# Altium footprint library First Board IMX6.PcbLib: 204 footprints (part 8 of 13)
Each footprint in its own frame and in the unit in brackets; x right, y up, seen from the top. Pads: shape width x height; smd on the part's side, far side on the other; paste and mask are expansions set on the pad; w line width, h text height; cw(c..) or ccw(c..) is an arc to the next point about the centre after c.
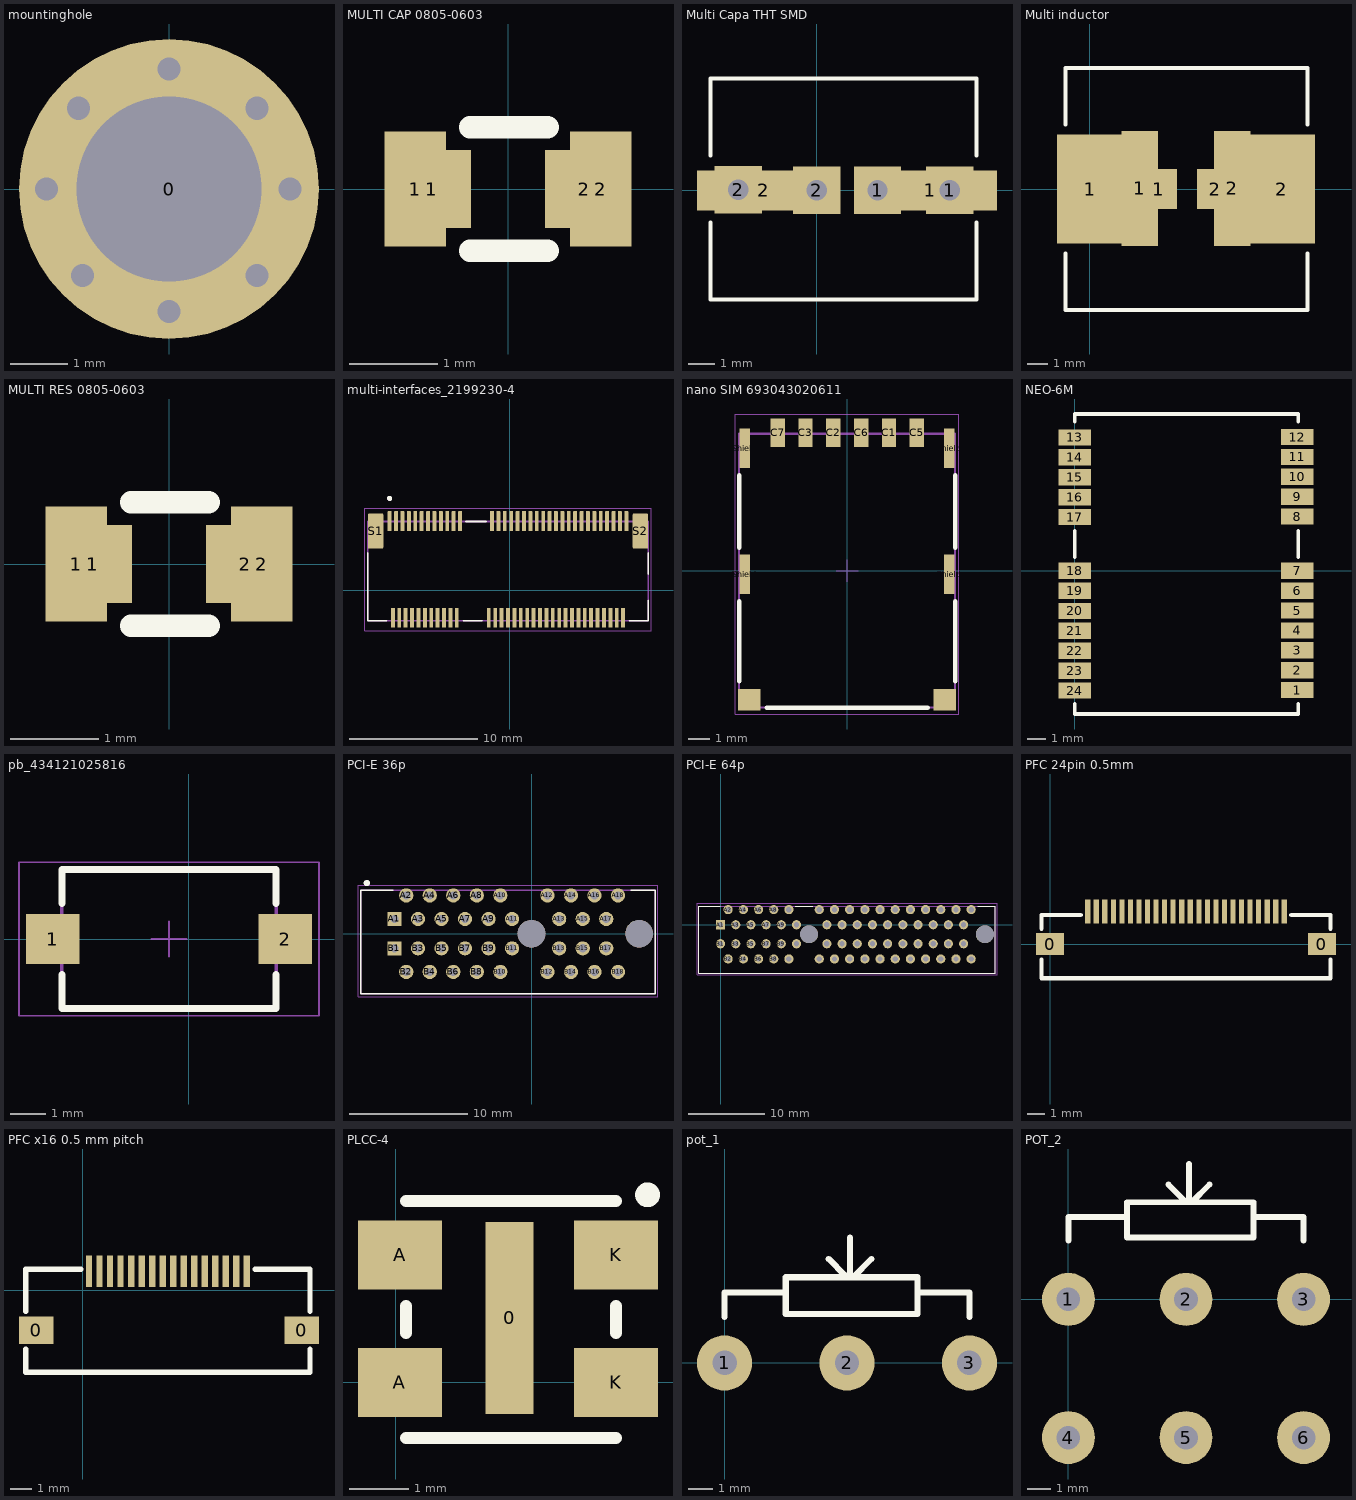
[diagram p7: the footprints below, top view; thin cyan lines are the x and y axes]

## mountinghole [mm]
pads (1):
  round 5.2 hole 3.2: 0(0,0)
via 2.1,0 diameter 0.7 hole 0.4
via 0,-2.125 diameter 0.7 hole 0.4
via -2.125,0 diameter 0.7 hole 0.4
via -1.5,-1.5 diameter 0.7 hole 0.4
via 1.525,-1.5 diameter 0.7 hole 0.4
via 1.525,1.4 diameter 0.7 hole 0.4
via -1.565,1.4 diameter 0.7 hole 0.4
via -0.002,2.083 diameter 0.7 hole 0.4

## MULTI CAP 0805-0603 [mm]
pads (4):
  rect 0.7x1.3 smd: 1(-1.05,0) 2(1.05,0)
  rect 0.889x0.889 smd: 1(-0.864,0) 2(0.864,0)
Top Overlay:
  lines w0.254: -0.431,-0.7 0.45,-0.7 ; -0.431,0.7 0.45,0.7
3D body "CAPACITOR 0805.step": height 0.63, standoff 0.03, extent -1,-0.615 1,0.635

## Multi Capa THT SMD [mil]
pads (6):
  rect 70x70 hole 30: 1(90,0) 1(196.85,0) 2(-116.14,0.98) 2(0,0)
  rect 196.85x59.06 smd: 1(168.31,0) 2(-78.74,0)
Top Overlay:
  lines w5.91: -157.48,-47.24 -157.48,-161.42 236.22,-161.42 236.22,-47.24 ; -157.48,51.18 -157.48,165.35 236.22,165.35 236.22,51.18
3D body "capacitor size F.step": height 401.77, standoff -0.2, extent -155.51,-162.4 234.25,164.37

## Multi inductor [mm]
pads (6):
  rect 3.3x5.4 smd: 1(0.025,0) 2(9.525,0)
  rect 1.8x5.7 smd: 1(2.475,0.025) 2(7.075,0.025)
  rect 1.8x2 smd: 1(3.425,0) 2(6.225,0)
Top Overlay:
  lines w0.2: -1.2,-3.2 -1.2,-6 10.8,-6 10.8,-3.2 ; -1.2,3.2 -1.2,6 10.8,6 10.8,3.2
3D body "inductor 6x6mm.step": height 8.25, standoff 0.25, extent -1.175,-6 10.825,6

## MULTI RES 0805-0603 [mm]
pads (4):
  rect 0.7x1.3 smd: 1(-1.05,0) 2(1.05,0)
  rect 0.889x0.889 smd: 1(-0.864,0) 2(0.864,0)
Top Overlay:
  lines w0.254: -0.431,-0.7 0.45,-0.7 ; -0.431,0.7 0.45,0.7
3D body "0805.step": height 0.58, standoff 0.03, extent -1.05,-0.625 0.95,0.625

## multi-interfaces_2199230-4 [mm]
pads (69):
  rrect15% 0.3x1.55 smd: 1(-9.377,5.402) 2(-9.127,-2.148) 3(-8.877,5.402) 4(-8.627,-2.148) 5(-8.377,5.402) 6(-8.127,-2.148) 7(-7.877,5.402) 8(-7.627,-2.148) 9(-7.377,5.402) 10(-7.127,-2.148) 11(-6.877,5.402) 12(-6.627,-2.148) 13(-6.377,5.402) 14(-6.127,-2.148) 15(-5.877,5.402) 16(-5.627,-2.148) 17(-5.377,5.402) 18(-5.127,-2.148) 19(-4.877,5.402) 20(-4.627,-2.148) 21(-4.377,5.402) 22(-4.127,-2.148) 23(-3.877,5.402) 32(-1.627,-2.148) 33(-1.377,5.402) 34(-1.127,-2.148) 35(-0.877,5.402) 36(-0.627,-2.148) 37(-0.377,5.402) 38(-0.127,-2.148) 39(0.123,5.402) 40(0.373,-2.148) 41(0.623,5.402) 42(0.873,-2.148) 43(1.123,5.402) 44(1.373,-2.148) 45(1.623,5.402) 46(1.873,-2.148) 47(2.123,5.402) 48(2.373,-2.148) 49(2.623,5.402) 50(2.873,-2.148) 51(3.123,5.402) 52(3.373,-2.148) 53(3.623,5.402) 54(3.873,-2.148) 55(4.123,5.402) 56(4.373,-2.148) 57(4.623,5.402) 58(4.873,-2.148) 59(5.123,5.402) 60(5.373,-2.148) 61(5.623,5.402) 62(5.873,-2.148) 63(6.123,5.402) 64(6.373,-2.148) 65(6.623,5.402) 66(6.873,-2.148) 67(7.123,5.402) 68(7.373,-2.148) 69(7.623,5.402) 70(7.873,-2.148) 71(8.123,5.402) 72(8.373,-2.148) 73(8.623,5.402) 74(8.873,-2.148) 75(9.123,5.402)
  rrect15% 1.2x2.75 smd: S1(-10.477,4.627) S2(10.223,4.627)
Top Overlay:
  circle w0.2: c-9.377,7.177 r0.1
  lines w0.127: -11.077,2.932 -11.077,-2.373 -9.597,-2.373 ; -3.627,-2.373 -2.127,-2.373 ; -3.407,5.377 -1.847,5.377 ; 9.343,-2.373 10.823,-2.373 10.823,-0.773 ; 10.823,1.247 10.823,2.932
Mechanical 13:
  circle w0.2: c-9.377,7.177 r0.1
  lines w0.127: -11.077,-2.373 -11.077,5.377 10.823,5.377 10.823,-2.373 -11.077,-2.373
Mechanical 15:
  lines w0.05: -11.327,-3.173 11.073,-3.173 11.073,6.427 -11.327,6.427 -11.327,-3.173
3D body "step_temp.STEP": height 4.2, standoff -0.65, extent -11.15,-2.75 10.75,5.95

## nano SIM 693043020611 [mm]
pads (12):
  rect 0.65x1.3 smd: C1(1.91,6.3) C2(-0.63,6.3) C3(-1.9,6.3) C5(3.18,6.3) C6(0.64,6.3) C7(-3.17,6.3)
  rect 0.48x1.8 smd: Shield(-4.67,-0.17) Shield(-4.67,5.58) Shield(4.66,-0.17) Shield(4.66,5.58)
  rect 1.03x1 smd: Shield(-4.465,-5.89) Shield(4.465,-5.89)
Top Overlay:
  lines w0.2: -4.93,-5.05 -4.93,-1.4 ; -4.93,1.05 -4.93,4.35 ; -3.665,-6.25 3.685,-6.25 ; 4.93,-5.05 4.93,-1.4 ; 4.93,1.05 4.93,4.35
Mechanical 11:
  lines w0.1: -4.93,-6.25 4.93,-6.25 4.93,6.25 -4.93,6.25 -4.93,-6.25
  text ".Designator" at -1.75,-0.7 h1.5
Mechanical 13:
  lines w0.1: -4.93,-6.25 -4.93,6.25 4.93,6.25 4.93,-6.25 -4.93,-6.25
Mechanical 15:
  lines w0.05: -0.5,0 0.5,0 ; 0,-0.5 0,0.5 ; -5.105,-6.54 -5.105,7.15 5.105,7.15 5.105,-6.54 -5.105,-6.54
3D body "693043020611.stp": height 1.2, standoff -0.01, extent -4.926,-6.25 4.936,6.25

## NEO-6M [mm]
pads (24):
  rect 1.8x0.9 smd: 1(12.305,-6.6) 2(12.305,-5.5) 3(12.305,-4.4) 4(12.305,-3.3) 5(12.305,-2.2) 6(12.305,-1.1) 7(12.305,0) 8(12.305,3) 9(12.305,4.1) 10(12.305,5.2) 11(12.305,6.3) 12(12.305,7.4) 13(0.005,7.375) 14(0.005,6.275) 15(0.005,5.175) 16(0.005,4.075) 17(0.005,2.975) 18(0.005,0) 19(0.005,-1.1) 20(0.005,-2.225) 21(0.005,-3.325) 22(0.005,-4.425) 23(0.005,-5.525) 24(0.005,-6.625)
Top Overlay:
  lines w0.2: 0,-7.35 0,-7.925 12.375,-7.925 12.375,-7.35 ; 0,0.75 0,2.2 ; 0,8.25 0,8.675 12.375,8.675 12.375,8.25 ; 12.375,0.75 12.375,2.2
3D body "UBLOX_GPS_NEO-6M.step": height 2.64, standoff 0, extent 0.005,-7.925 12.365,8.675

## pb_434121025816 [mm]
pads (2):
  rect 1.5x1.4 smd: 1(-3.8,0) 2(2.7,0)
Top Overlay:
  lines w0.2: -3.55,-1 -3.55,-1.95 2.45,-1.95 2.45,-1 ; -3.55,1 -3.55,1.95 2.45,1.95 2.45,1
Mechanical 11:
  lines w0.1: -3.55,-0.5 -4.2,-0.5 -4.2,0.5 -3.55,0.5 ; 2.45,-0.5 3.1,-0.5 3.1,0.5 2.45,0.5 ; -3.55,-1.95 -3.55,1.95 2.45,1.95 2.45,-1.95 -3.55,-1.95
  text ".Designator" at -2.3,-0.75 h1.5
Mechanical 13:
  lines w0.1: -3.55,-0.5 -4.2,-0.5 -4.2,0.5 -3.55,0.5 ; 2.45,-0.5 3.1,-0.5 3.1,0.5 2.45,0.5 ; -3.55,-1.95 2.45,-1.95 2.45,1.95 -3.55,1.95 -3.55,-1.95
Mechanical 15:
  lines w0.05: -1.05,0 -0.05,0 ; -0.55,-0.5 -0.55,0.5 ; -4.75,-2.15 3.65,-2.15 3.65,2.15 -4.75,2.15 -4.75,-2.15
3D body "4341x10258xx.stp": height 2.5, standoff 0, extent -4.2,-1.95 3.1,1.95

## PCI-E 36p [mm]
pads (38):
  rect 1.208x1.208 hole 0.7: A1(-11.65,1.25) B1(-11.65,-1.25)
  round 1.208 hole 0.7: A2(-10.65,3.25) A3(-9.65,1.25) A4(-8.65,3.25) A5(-7.65,1.25) A6(-6.65,3.25) A7(-5.65,1.25) A8(-4.65,3.25) A9(-3.65,1.25) A10(-2.65,3.25) A11(-1.65,1.25) A12(1.35,3.25) A13(2.35,1.25) A14(3.35,3.25) A15(4.35,1.25) A16(5.35,3.25) A17(6.35,1.25) A18(7.35,3.25) B2(-10.65,-3.25) B3(-9.65,-1.25) B4(-8.65,-3.25) B5(-7.65,-1.25) B6(-6.65,-3.25) B7(-5.65,-1.25) B8(-4.65,-3.25) B9(-3.65,-1.25) B10(-2.65,-3.25) B11(-1.65,-1.25) B12(1.35,-3.25) B13(2.35,-1.25) B14(3.35,-3.25) B15(4.35,-1.25) B16(5.35,-3.25) B17(6.35,-1.25) B18(7.35,-3.25)
  round 2.35 hole 2.35 unplated: ""(0,0) ""(9.15,0)
Top Overlay:
  circle w0.254: c-14,4.3 r0.141
  lines w0.127: -11.75,3.7 -14.5,3.7 -14.5,-5.1 10.5,-5.1 10.5,3.7 8.45,3.7
Mechanical 13:
  lines w0.127: -14.5,-5.1 10.5,-5.1 10.5,3.7 -14.5,3.7 -14.5,-5.1
Mechanical 15:
  lines w0.05: -14.75,-5.35 10.75,-5.35 10.75,4.11 -14.75,4.11 -14.75,-5.35
3D body "PCI-E 36p.STEP": height 11, standoff -4.4, extent -14.7,-5.2 10.3,3.6

## PCI-E 64p [mm]
pads (66):
  rect 1.208x1.208 hole 0.7: A1(0,0)
  round 1.208 hole 0.7: A2(1,2) A3(2,0) A4(3,2) A5(4,0) A6(5,2) A7(6,0) A8(7,2) A9(8,0) A10(9,2) A11(10,0) A12(13,2) A13(14,0) A14(15,2) A15(16,0) A16(17,2) A17(18,0) A18(19,2) A19(20,0) A20(21,2) A21(22,0) A22(23,2) A23(24,0) A24(25,2) A25(26,0) A26(27,2) A27(28,0) A28(29,2) A29(30,0) A30(31,2) A31(32,0) A32(33,2) B1(0,-2.5) B2(1,-4.5) B3(2,-2.5) B4(3,-4.5) B5(4,-2.5) B6(5,-4.5) B7(6,-2.5) B8(7,-4.5) B9(8,-2.5) B10(9,-4.5) B11(10,-2.5) B12(13,-4.5) B13(14,-2.5) B14(15,-4.5) B15(16,-2.5) B16(17,-4.5) B17(18,-2.5) B18(19,-4.5) B19(20,-2.5) B20(21,-4.5) B21(22,-2.5) B22(23,-4.5) B23(24,-2.5) B24(25,-4.5) B25(26,-2.5) B26(27,-4.5) B27(28,-2.5) B28(29,-4.5) B29(30,-2.5) B30(31,-4.5) B31(32,-2.5) B32(33,-4.5)
  round 2.35 hole 2.35 unplated: ""(11.65,-1.25) ""(34.8,-1.25)
Top Overlay:
  lines w0.127: -0.05,2.45 -2.85,2.45 -2.85,-6.35 36.15,-6.35 36.15,2.45 33.85,2.45 ; 9.85,2.45 12.15,2.45
Mechanical 13:
  lines w0.127: -2.85,-6.35 -2.85,2.45 36.15,2.45 36.15,-6.35 -2.85,-6.35
Mechanical 15:
  lines w0.05: -3.1,-6.6 36.4,-6.6 36.4,2.86 -3.1,2.86 -3.1,-6.6
3D body "PCI-E 64 p.step": height 11, standoff -4.4, extent -2.85,-4.7 36.15,4.1

## PFC 24pin 0.5mm [mm]
pads (26):
  rect 1.65x1.3 smd: 0(0,0) 0(15.9,0)
  rect 0.3x1.4 smd: 1(2.2,1.9) 2(2.7,1.9) 3(3.2,1.9) 4(3.7,1.9) 5(4.2,1.9) 6(4.7,1.9) 7(5.2,1.9) 8(5.7,1.9) 9(6.2,1.9) 10(6.7,1.9) 11(7.2,1.9) 12(7.7,1.9) 13(8.2,1.9) 14(8.7,1.9) 15(9.2,1.9) 16(9.7,1.9) 17(10.2,1.9) 18(10.7,1.9) 19(11.2,1.9) 20(11.7,1.9) 21(12.2,1.9) 22(12.7,1.9) 23(13.2,1.9) 24(13.7,1.9)
Top Overlay:
  lines w0.254: -0.5,-0.9 -0.5,-2 16.4,-2 16.4,-0.9 ; -0.5,0.9 -0.5,1.7 ; 14.1,1.7 16.4,1.7 16.4,0.9 ; -0.5,1.7 1.8,1.7 -0.5,1.7
3D body "Molex 24 broches 0.5mm pitch545502471.stp": height 1.2, standoff 0, extent -0.65,-2.925 16.55,2.075

## PFC x16 0.5 mm pitch [mm]
pads (18):
  rect 1.65x1.3 smd: 0(-2.2,-1.9) 0(10.4,-1.9)
  rect 0.3x1.5 smd: 1(0.3,0.9) 2(0.8,0.9) 3(1.3,0.9) 4(1.8,0.9) 5(2.3,0.9) 6(2.8,0.9) 7(3.3,0.9) 8(3.8,0.9) 9(4.3,0.9) 10(4.8,0.9) 11(5.3,0.9) 12(5.8,0.9) 13(6.3,0.9) 14(6.8,0.9) 15(7.3,0.9) 16(7.8,0.9)
Top Overlay:
  lines w0.254: -2.7,-2.8 -2.7,-3.9 10.8,-3.9 10.8,-2.8 ; -2.7,-1 -2.7,1 -0.1,1 ; 8.2,1 10.8,1 10.8,-1
3D body "PFC 5051101692.stp": height 1.88, standoff -0.02, extent -2.65,-4.18 10.85,1.12

## PLCC-4 [mm]
pads (5):
  rect 0.8x3.2 smd: 0(1.9,1.075)
  rect 1.4x1.15 smd: A(0.075,0) A(0.075,2.125) K(3.675,0) K(3.675,2.125)
Top Overlay:
  circle w0.254: c4.2,3.125 r0.079
  lines w0.2: 0.175,-0.925 3.675,-0.925 ; 0.175,0.825 0.175,1.275 ; 0.175,3.025 3.675,3.025 ; 3.675,0.825 3.675,1.275
3D body "PLCC4.step": height 1.2, standoff 0.1, extent 0.175,-0.675 3.675,2.825

## pot_1 [mil]
pads (3):
  round 90 hole 40: 1(0,0) 2(200,0) 3(400,0)
Top Overlay:
  lines w10: 0,75 0,105 0,115 100,115 ; 170,170 197.5,142.5 205,142.5 205,205 ; 210,140 240,170 ; 315,115 400,115 400,75 ; 100,80 315,80 315,140 100,140 100,80
3D body "Potentiometer.step": height 102, standoff -880, extent -130,-730 530,220

## POT_2 [mil]
pads (6):
  round 90 hole 40: 1(0,0) 2(200,0) 3(400,0) 4(0,-235) 5(200,-235) 6(400,-235)
Top Overlay:
  lines w10: 0,100 0,130 0,140 100,140 ; 170,195 197.5,167.5 205,167.5 205,230 ; 210,165 240,195 ; 315,140 400,140 400,100 ; 100,105 100,165 315,165 315,105 100,105
3D body "pot double.step": height 79.92, standoff -884.65, extent -134.64,-1544.4 534.65,63.87